# Altium footprint library MyPcbLib.PcbLib: 278 footprints (part 12 of 18)
Each footprint in its own frame and in the unit in brackets; x right, y up, seen from the top. Pads: shape width x height; smd on the part's side, far side on the other; paste and mask are expansions set on the pad; w line width, h text height; cw(c..) or ccw(c..) is an arc to the next point about the centre after c.
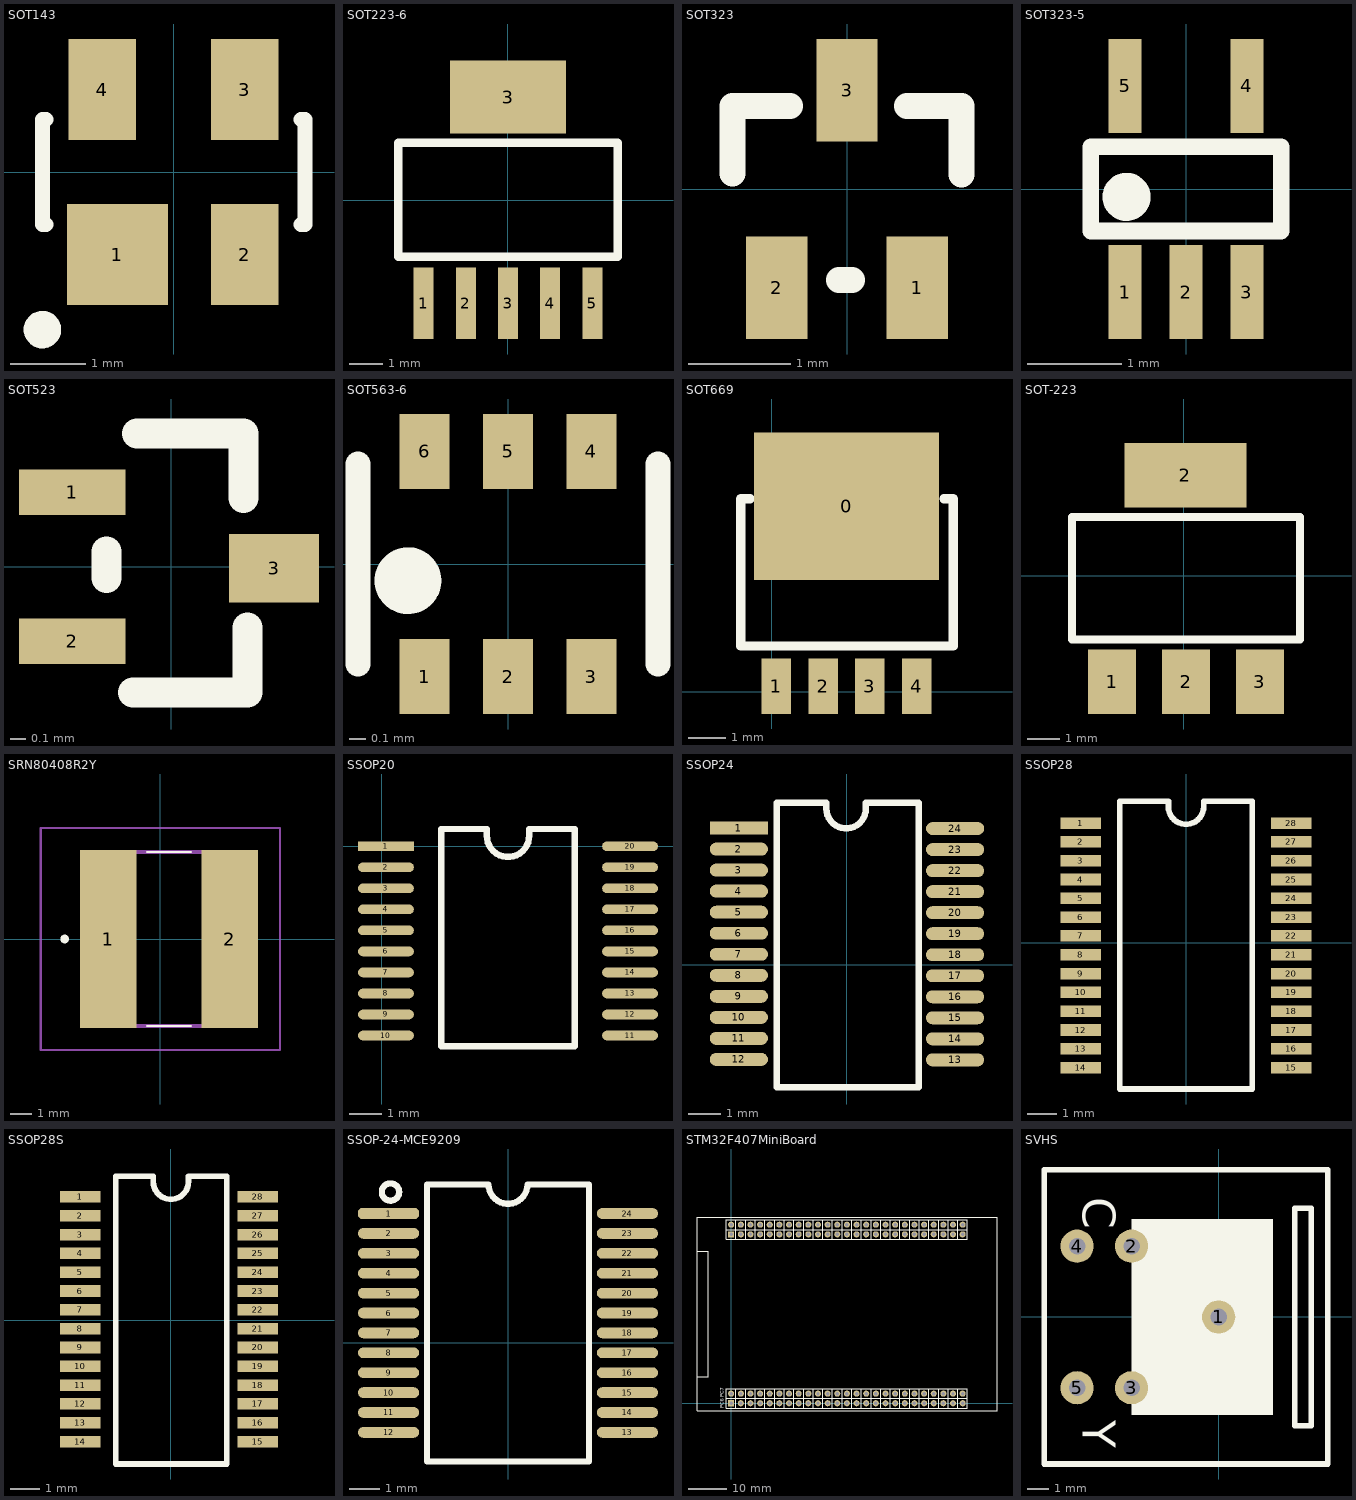
[diagram p11: the footprints below, top view; thin cyan lines are the x and y axes]

## SOT143 [mm] "SOT-143; 4 Leads; Body 3 x 2.6 mm, inc. leads (LxW max)"
height 1.1
pads (4):
  rect 1.35x1.35 smd: 1(-0.75,-1.1)
  rect 0.9x1.35 smd: 2(0.95,-1.1) 3(0.95,1.1) 4(-0.95,1.1)
Top Overlay:
  circle w0.25: c-1.75,-2.1 r0.125
  lines w0.2: -1.7,-0.7 -1.75,-0.7 -1.75,0.7 -1.7,0.7 ; 1.7,-0.7 1.75,-0.7 1.75,0.7 1.7,0.7
3D body: height 0.2, standoff 0, extent 0.779,-1.464 1.125,-0.414
3D body: height 0.2, standoff 0, extent -1.166,-1.503 -0.82,-0.452
3D body: height 0.2, standoff 0, extent 0.784,0.408 1.13,1.459
3D body: height 0.2, standoff 0, extent -1.149,0.408 -0.803,1.459
3D body: height 0.8, standoff 0, extent -1.516,-0.878 1.514,0.931

## SOT223-6 [mm]
pads (6):
  rect 0.6x2.15 smd: 1(-2.54,-3.1) 2(-1.27,-3.1) 3(0,-3.1) 4(1.27,-3.1) 5(2.54,-3.1)
  rect 3.5x2.2 smd: 3(0,3.1)
Top Overlay:
  lines w0.254: -3.3,-1.7 3.3,-1.7 3.3,1.73 -3.3,1.73 -3.3,-1.7
3D body "User Library-SOT223-6.STEP": height 1.9, standoff -0.17, extent -3.299,-3.681 3.251,3.579

## SOT323 [mm]
pads (3):
  rect 0.6x1 smd: 1(0.686,-0.965) 2(-0.686,-0.965) 3(0,0.965)
Top Overlay:
  lines w0.254: -1.118,0.152 -1.118,0.813 -0.559,0.813 ; -0.076,-0.889 0.051,-0.889 ; 0.584,0.813 1.118,0.813 1.118,0.143
3D body "SOT323 (SC70-3)-1.STEP": height 1.1, standoff 0, extent -1.092,-1.097 1.108,1.148

## SOT323-5 [mm] "SC70"
pads (5):
  rect 0.35x1 smd: 1(-0.65,-1.1) 2(0,-1.1) 3(0.65,-1.1) 4(0.65,1.1) 5(-0.65,1.1)
Top Overlay:
  circle w0.254: c-0.635,-0.084 r0.13
  lines w0.178: -1.016,-0.447 1.016,-0.447 1.016,0.449 -1.016,0.449 -1.016,-0.447
3D body "sot353.step": height 1, standoff 0, extent -1.05,-1.158 1.05,1.142

## SOT523 [mil]
pads (3):
  rect 28x12 smd: 1(-25.98,19.58) 2(-25.98,-19.58)
  rect 23.62x18 smd: 3(26.98,-0.46)
Top Overlay:
  lines w7.87: -17,-3 -17,4 ; -10,-33 20,-33 20,-16 ; -9,35 19,35 19,18
3D body "SOT-523.step": height 31.5, standoff 0, extent -32.5,-31.49 30.49,31.5

## SOT563-6 [mm]
pads (6):
  rect 0.3x0.45 smd: 1(-0.5,-0.675) 2(0,-0.675) 3(0.5,-0.675) 4(0.5,0.675) 5(0,0.675) 6(-0.5,0.675)
Top Overlay:
  circle w0.2: c-0.6,-0.1 r0.1
  lines w0.15: -0.9,-0.6 -0.9,0.6 ; 0.9,-0.6 0.9,0.6
3D body "SW3dPS-SOT-563.STEP": height 0.58, standoff 0, extent -0.8,-0.8 0.8,0.826

## SOT669 [mm] "IFPAK"
pads (5):
  rect 5x4 smd: 0(2.032,5.029)
  rect 0.8x1.5 smd: 1(0.127,0.152) 2(1.397,0.152) 3(2.667,0.152) 4(3.937,0.152)
Top Overlay:
  lines w0.254: -0.584,5.232 -0.838,5.232 -0.838,1.245 4.928,1.245 4.928,5.232 4.674,5.232
3D body "User Library-SOT669-CW.step": height 1.55, standoff 0.35, extent -0.418,-0.002 4.482,6.426

## SOT-223 [mil]
pads (4):
  rect 59x79 smd: 1(-88,-130) 2(2.55,-130) 3(93.1,-130)
  rect 150x79 smd: 2(1.88,123.54)
Top Overlay:
  lines w10: -137.45,-78 -137.45,72 142.55,72 142.55,-78 -137.45,-78
3D body "SOT-223_MP04A.STEP": height 66.93, standoff 0, extent -126.41,-138.72 129.5,135.3

## SRN80408R2Y [mm]
pads (2):
  rect 2.6x8.2 smd: 1(-2.4,0) 2(3.2,0)
Top Overlay:
  lines w0.1: -0.6,-4 1.4,-4 ; -0.6,4 1.4,4
  lines w0.2: -4.4,-0.1 cw(c-4.4,0) -4.4,0.1 cw(c-4.4,0) -4.4,-0.1
Mechanical 15:
  lines w0.1: -5.5,-5.1 -5.5,5.1 5.5,5.1 5.5,-5.1 -5.5,-5.1
  lines w0.2: -3.6,-4 -3.6,4 4.4,4 4.4,-4 -3.6,-4

## SSOP20 [mm]
pads (20):
  rect 1.727x0.3 smd: 1(0.127,0)
  oval 1.727x0.3 smd: 2(0.127,-0.65) 3(0.127,-1.3) 4(0.127,-1.95) 5(0.127,-2.6) 6(0.127,-3.25) 7(0.127,-3.9) 8(0.127,-4.55) 9(0.127,-5.2) 10(0.127,-5.85) 11(7.673,-5.85) 12(7.673,-5.2) 13(7.673,-4.55) 14(7.673,-3.9) 15(7.673,-3.25) 16(7.673,-2.6) 17(7.673,-1.95) 18(7.673,-1.3) 19(7.673,-0.65) 20(7.673,0)
Top Overlay:
  lines w0.2: 1.835,-6.175 5.965,-6.175 5.965,0.533 4.555,0.533 4.555,0.325 cw(c3.9,0.325) 3.245,0.325 3.245,0.533 1.835,0.533 1.835,-6.175
3D body "SSOP-20.STEP": height 1.79, standoff -0.05, extent -0.013,-6.52 7.887,0.78

## SSOP24 [mm]
pads (24):
  rect 1.8x0.4 smd: 1(-3.326,4.229)
  oval 1.8x0.4 smd: 2(-3.326,3.579) 3(-3.326,2.93) 4(-3.326,2.28) 5(-3.326,1.63) 6(-3.326,0.981) 7(-3.326,0.331) 8(-3.326,-0.319) 9(-3.326,-0.968) 10(-3.326,-1.618) 11(-3.326,-2.267) 12(-3.326,-2.917) 13(3.353,-2.932) 14(3.353,-2.282) 15(3.353,-1.632) 16(3.353,-0.983) 17(3.353,-0.333) 18(3.353,0.316) 19(3.353,0.966) 20(3.353,1.616) 21(3.353,2.265) 22(3.353,2.915) 23(3.353,3.565) 24(3.354,4.214)
Top Overlay:
  lines w0.2: -2.159,-3.785 2.235,-3.785 2.235,5.01 0.597,5.01 0.597,4.827 cw(c-0.013,4.827) -0.622,4.827 -0.622,5.01 -2.159,5.01 -2.159,-3.785
3D body "SSOP 24 PIN_.step": height 1.78, standoff -0.21, extent -3.924,-3.654 3.976,4.976

## SSOP28 [mil]
height 93.7
pads (28):
  rect 55x15.75 smd: 1(-142.95,162.5) 2(-142.95,136.92) 3(-142.95,111.34) 4(-142.95,85.77) 5(-142.95,60.19) 6(-142.95,34.61) 7(-142.95,9.04) 8(-142.95,-16.54) 9(-142.95,-42.12) 10(-142.95,-67.69) 11(-142.95,-93.27) 12(-142.95,-118.85) 13(-142.95,-144.42) 14(-143,-170) 15(142.95,-170) 16(142.95,-144.42) 17(142.95,-118.85) 18(142.95,-93.27) 19(142.95,-67.69) 20(142.95,-42.12) 21(142.95,-16.54) 22(142.95,9.04) 23(142.95,34.62) 24(142.95,60.19) 25(142.95,85.77) 26(142.95,111.35) 27(142.95,136.92) 28(142.95,162.5)
Top Overlay:
  lines w7.87: -90,-199 -90,192 -23.99,192 -23.99,184.8 ccw(c0,184.8) 23.99,184.8 23.99,192 90,192 90,-199 -90,-199
3D body "TSSOP28.STEP": height 41.34, standoff 0, extent -133.91,-196.91 125.93,188.92

## SSOP28S [mil]
pads (28):
  rect 55x15.75 smd: 1(-122.95,167.5) 2(-122.95,141.92) 3(-122.95,116.34) 4(-122.95,90.77) 5(-122.95,65.19) 6(-122.95,39.61) 7(-122.95,14.04) 8(-122.95,-11.54) 9(-122.95,-37.12) 10(-122.95,-62.69) 11(-122.95,-88.27) 12(-122.95,-113.85) 13(-122.95,-139.42) 14(-123,-165) 15(117.95,-165) 16(117.95,-139.42) 17(117.95,-113.85) 18(117.95,-88.27) 19(117.95,-62.69) 20(117.95,-37.12) 21(117.95,-11.54) 22(117.95,14.04) 23(117.95,39.62) 24(117.95,65.19) 25(117.95,90.77) 26(117.95,116.35) 27(117.95,141.92) 28(117.95,167.5)
Top Overlay:
  lines w7.87: -75,-195.5 -75,195.5 -23.99,195.5 -23.99,188.3 ccw(c0,188.3) 23.99,188.3 23.99,195.5 76,195.5 76,-195.5 -75,-195.5
3D body "TSSOP28.STEP": height 41.34, standoff 0, extent -128.87,-192.5 130.97,193.32

## SSOP-24-MCE9209 [mm]
pads (24):
  oct 2x0.35 smd: 1(-3.9,4.225)
  oval 2x0.35 smd: 2(-3.9,3.575) 3(-3.9,2.925) 4(-3.9,2.275) 5(-3.9,1.625) 6(-3.9,0.975) 7(-3.9,0.325) 8(-3.9,-0.325) 9(-3.9,-0.975) 10(-3.9,-1.625) 11(-3.9,-2.275) 12(-3.9,-2.925) 13(3.9,-2.925) 14(3.9,-2.275) 15(3.9,-1.625) 16(3.9,-0.975) 17(3.9,-0.325) 18(3.9,0.325) 19(3.9,0.975) 20(3.9,1.625) 21(3.9,2.275) 22(3.9,2.925) 23(3.9,3.575) 24(3.9,4.225)
Top Overlay:
  circle w0.203: c-3.839,4.928 r0.283
  lines w0.203: -2.65,-3.875 2.65,-3.875 2.65,5.175 0.635,5.175 cw(c0,5.175) -0.635,5.175 -2.65,5.175 -2.65,-3.875
3D body "SSOP-24-MCE9209.STEP": height 1.54, standoff 0, extent -4.135,-3.574 3.881,4.826

## STM32F407MiniBoard [mm]
pads (100):
  rect 1.6x1.6 hole 0.9: 1(0,0) 51(0,44.475)
  round 1.6 hole 0.9: 2(0,2.54) 3(2.54,0) 4(2.54,2.54) 5(5.08,0) 6(5.08,2.54) 7(7.62,0) 8(7.62,2.54) 9(10.16,0) 10(10.16,2.54) 11(12.7,0) 12(12.7,2.54) 13(15.24,0) 14(15.24,2.54) 15(17.78,0) 16(17.78,2.54) 17(20.32,0) 18(20.32,2.54) 19(22.86,0) 20(22.86,2.54) 21(25.4,0) 22(25.4,2.54) 23(27.94,0) 24(27.94,2.54) 25(30.48,0) 26(30.48,2.54) 27(33.02,0) 28(33.02,2.54) 29(35.56,0) 30(35.56,2.54) 31(38.1,0) 32(38.1,2.54) 33(40.64,0) 34(40.64,2.54) 35(43.18,0) 36(43.18,2.54) 37(45.72,0) 38(45.72,2.54) 39(48.26,0) 40(48.26,2.54) 41(50.8,0) 42(50.8,2.54) 43(53.34,0) 44(53.34,2.54) 45(55.88,0) 46(55.88,2.54) 47(58.42,0) 48(58.42,2.54) 49(60.96,0) 50(60.96,2.54) 52(2.54,44.475) 53(5.08,44.475) 54(7.62,44.475) 55(10.16,44.475) 56(12.7,44.475) 57(15.24,44.475) 58(17.78,44.475) 59(20.32,44.475) 60(22.86,44.475) 61(25.4,44.475) 62(27.94,44.475) 63(30.48,44.475) 64(33.02,44.475) 65(35.56,44.475) 66(38.1,44.475) 67(40.64,44.475) 68(43.18,44.475) 69(45.72,44.475) 70(48.26,44.475) 71(50.8,44.475) 72(53.34,44.475) 73(55.88,44.475) 74(58.42,44.475) 75(60.96,44.475) 76(60.96,47.015) 77(58.42,47.015) 78(55.88,47.015) 79(53.34,47.015) 80(50.8,47.015) 81(48.26,47.015) 82(45.72,47.015) 83(43.18,47.015) 84(40.64,47.015) 85(38.1,47.015) 86(35.56,47.015) 87(33.02,47.015) 88(30.48,47.015) 89(27.94,47.015) 90(25.4,47.015) 91(22.86,47.015) 92(20.32,47.015) 93(17.78,47.015) 94(15.24,47.015) 95(12.7,47.015) 96(10.16,47.015) 97(7.62,47.015) 98(5.08,47.015) 99(2.54,47.015) 100(0,47.015)
Top Overlay:
  lines w0.2: 62.23,-1.27 -1.27,-1.27 -1.27,3.81 62.23,3.81 ; 62.23,43.205 -1.27,43.205 -1.27,48.285 62.23,48.285
  lines w0.203: -1.27,1.27 62.23,1.27 ; -1.27,45.745 62.23,45.745 ; 1.27,-1.27 1.27,3.81 ; 1.27,43.205 1.27,48.285 ; 3.81,-1.27 3.81,3.81 ; 3.81,43.205 3.81,48.285 ; 6.35,-1.27 6.35,3.81 ; 6.35,43.205 6.35,48.285 ; 8.89,-1.27 8.89,3.81 ; 8.89,43.205 8.89,48.285 ; 11.43,-1.27 11.43,3.81 ; 11.43,43.205 11.43,48.285 ; 13.97,-1.27 13.97,3.81 ; 13.97,43.205 13.97,48.285 ; 16.51,-1.27 16.51,3.81 ; 16.51,43.205 16.51,48.285 ; 19.05,-1.27 19.05,3.81 ; 19.05,43.205 19.05,48.285 ; 21.59,-1.27 21.59,3.81 ; 21.59,43.205 21.59,48.285 ; 24.13,-1.27 24.13,3.81 ; 24.13,43.205 24.13,48.285 ; 26.67,-1.27 26.67,3.81 ; 26.67,43.205 26.67,48.285 ; 29.21,-1.27 29.21,3.81 ; 29.21,43.205 29.21,48.285 ; 31.75,-1.27 31.75,3.81 ; 31.75,43.205 31.75,48.285 ; 34.29,-1.27 34.29,3.81 ; 34.29,43.205 34.29,48.285 ; 36.83,-1.27 36.83,3.81 ; 36.83,43.205 36.83,48.285 ; 39.37,-1.27 39.37,3.81 ; 39.37,43.205 39.37,48.285 ; 41.91,-1.27 41.91,3.81 ; 41.91,43.205 41.91,48.285 ; 44.45,-1.27 44.45,3.81 ; 44.45,43.205 44.45,48.285 ; 46.99,-1.27 46.99,3.81 ; 46.99,43.205 46.99,48.285 ; 49.53,-1.27 49.53,3.81 ; 49.53,43.205 49.53,48.285 ; 52.07,-1.27 52.07,3.81 ; 52.07,43.205 52.07,48.285 ; 54.61,-1.27 54.61,3.81 ; 54.61,43.205 54.61,48.285 ; 57.15,-1.27 57.15,3.81 ; 57.15,43.205 57.15,48.285 ; 59.69,-1.27 59.69,3.81 ; 59.69,43.205 59.69,48.285 ; 62.23,-1.27 62.23,3.81 ; 62.23,43.205 62.23,48.285
  lines w0.254: -9,7 -8,7 -6,7 -6,40 -9,40 ; -9,-2 -9,48.285 -9,49 62.23,49 70,49 70,-2 -1.27,-2 -9,-2
  text "PC6 PC7" at -2,-1.27 h1
3D body "HDR2.54-1x2P.STEP": height 8.5, standoff -3, extent 57.15,-1.27 59.69,3.81
3D body "HDR2.54-1x2P.STEP": height 8.5, standoff -3, extent 49.53,-1.27 52.07,3.81
3D body "HDR2.54-1x2P.STEP": height 8.5, standoff -3, extent 54.61,-1.27 57.15,3.81
3D body "HDR2.54-1x2P.STEP": height 8.5, standoff -3, extent 52.07,-1.27 54.61,3.81
3D body "HDR2.54-1x2P.STEP": height 8.5, standoff -3, extent 59.69,-1.27 62.23,3.81
3D body "HDR2.54-1x2P.STEP": height 8.5, standoff -3, extent 41.91,-1.27 44.45,3.81
3D body "HDR2.54-1x2P.STEP": height 8.5, standoff -3, extent 44.45,-1.27 46.99,3.81
3D body "HDR2.54-1x2P.STEP": height 8.5, standoff -3, extent 36.83,-1.27 39.37,3.81
3D body "HDR2.54-1x2P.STEP": height 8.5, standoff -3, extent 39.37,-1.27 41.91,3.81
3D body "HDR2.54-1x2P.STEP": height 8.5, standoff -3, extent 46.99,-1.27 49.53,3.81
3D body "HDR2.54-1x2P.STEP": height 8.5, standoff -3, extent 29.21,-1.27 31.75,3.81
3D body "HDR2.54-1x2P.STEP": height 8.5, standoff -3, extent 31.75,-1.27 34.29,3.81
3D body "HDR2.54-1x2P.STEP": height 8.5, standoff -3, extent 24.13,-1.27 26.67,3.81
3D body "HDR2.54-1x2P.STEP": height 8.5, standoff -3, extent 26.67,-1.27 29.21,3.81
3D body "HDR2.54-1x2P.STEP": height 8.5, standoff -3, extent 34.29,-1.27 36.83,3.81
3D body "HDR2.54-1x2P.STEP": height 8.5, standoff -3, extent 16.51,-1.27 19.05,3.81
3D body "HDR2.54-1x2P.STEP": height 8.5, standoff -3, extent 19.05,-1.27 21.59,3.81
3D body "HDR2.54-1x2P.STEP": height 8.5, standoff -3, extent 11.43,-1.27 13.97,3.81
3D body "HDR2.54-1x2P.STEP": height 8.5, standoff -3, extent 13.97,-1.27 16.51,3.81
3D body "HDR2.54-1x2P.STEP": height 8.5, standoff -3, extent 21.59,-1.27 24.13,3.81
3D body "HDR2.54-1x2P.STEP": height 8.5, standoff -3, extent 3.81,-1.27 6.35,3.81
3D body "HDR2.54-1x2P.STEP": height 8.5, standoff -3, extent 6.35,-1.27 8.89,3.81
3D body "HDR2.54-1x2P.STEP": height 8.5, standoff -3, extent -1.27,-1.27 1.27,3.81
3D body "HDR2.54-1x2P.STEP": height 8.5, standoff -3, extent 1.27,-1.27 3.81,3.81
3D body "HDR2.54-1x2P.STEP": height 8.5, standoff -3, extent 8.89,-1.27 11.43,3.81
3D body "HDR2.54-1x2P.STEP": height 8.5, standoff -3, extent 8.89,43.205 11.43,48.285
3D body "HDR2.54-1x2P.STEP": height 8.5, standoff -3, extent 1.27,43.205 3.81,48.285
3D body "HDR2.54-1x2P.STEP": height 8.5, standoff -3, extent -1.27,43.205 1.27,48.285
3D body "HDR2.54-1x2P.STEP": height 8.5, standoff -3, extent 6.35,43.205 8.89,48.285
3D body "HDR2.54-1x2P.STEP": height 8.5, standoff -3, extent 3.81,43.205 6.35,48.285
3D body "HDR2.54-1x2P.STEP": height 8.5, standoff -3, extent 21.59,43.205 24.13,48.285
3D body "HDR2.54-1x2P.STEP": height 8.5, standoff -3, extent 13.97,43.205 16.51,48.285
3D body "HDR2.54-1x2P.STEP": height 8.5, standoff -3, extent 11.43,43.205 13.97,48.285
3D body "HDR2.54-1x2P.STEP": height 8.5, standoff -3, extent 19.05,43.205 21.59,48.285
3D body "HDR2.54-1x2P.STEP": height 8.5, standoff -3, extent 16.51,43.205 19.05,48.285
3D body "HDR2.54-1x2P.STEP": height 8.5, standoff -3, extent 34.29,43.205 36.83,48.285
3D body "HDR2.54-1x2P.STEP": height 8.5, standoff -3, extent 26.67,43.205 29.21,48.285
3D body "HDR2.54-1x2P.STEP": height 8.5, standoff -3, extent 24.13,43.205 26.67,48.285
3D body "HDR2.54-1x2P.STEP": height 8.5, standoff -3, extent 31.75,43.205 34.29,48.285
3D body "HDR2.54-1x2P.STEP": height 8.5, standoff -3, extent 29.21,43.205 31.75,48.285
3D body "HDR2.54-1x2P.STEP": height 8.5, standoff -3, extent 46.99,43.205 49.53,48.285
3D body "HDR2.54-1x2P.STEP": height 8.5, standoff -3, extent 39.37,43.205 41.91,48.285
3D body "HDR2.54-1x2P.STEP": height 8.5, standoff -3, extent 36.83,43.205 39.37,48.285
3D body "HDR2.54-1x2P.STEP": height 8.5, standoff -3, extent 44.45,43.205 46.99,48.285
3D body "HDR2.54-1x2P.STEP": height 8.5, standoff -3, extent 41.91,43.205 44.45,48.285
3D body "HDR2.54-1x2P.STEP": height 8.5, standoff -3, extent 59.69,43.205 62.23,48.285
3D body "HDR2.54-1x2P.STEP": height 8.5, standoff -3, extent 52.07,43.205 54.61,48.285
3D body "HDR2.54-1x2P.STEP": height 8.5, standoff -3, extent 54.61,43.205 57.15,48.285
3D body "HDR2.54-1x2P.STEP": height 8.5, standoff -3, extent 49.53,43.205 52.07,48.285
3D body "HDR2.54-1x2P.STEP": height 8.5, standoff -3, extent 57.15,43.205 59.69,48.285

## SVHS [mil] "S VIDEO PORT"
pads (5):
  round 60 hole 30: 1(0,0) 2(-157.48,127.95) 3(-157.48,-127.95) 4(-255.91,127.95) 5(-255.91,-127.95)
Top Overlay:
  rectangle: -157.48,-177.17 98.43,177.17
  lines w10: -314.96,-265.75 196.85,-265.75 196.85,265.75 -314.96,265.75 -314.96,-265.75 ; 137.8,-196.85 137.8,196.85 167.32,196.85 167.32,-196.85 137.8,-196.85
  text "C" at -246.06,216.54 h60
  text "Y" at -246.06,-187.01 h60
3D body "SVHS.STEP": height 767.72, standoff -59.06, extent -314.96,-255.9 118.11,255.91